# Altium footprint library TangCW.PcbLib: 46 footprints (part 1 of 3)
Each footprint in its own frame and in the unit in brackets; x right, y up, seen from the top. Pads: shape width x height; smd on the part's side, far side on the other; paste and mask are expansions set on the pad; w line width, h text height; cw(c..) or ccw(c..) is an arc to the next point about the centre after c.
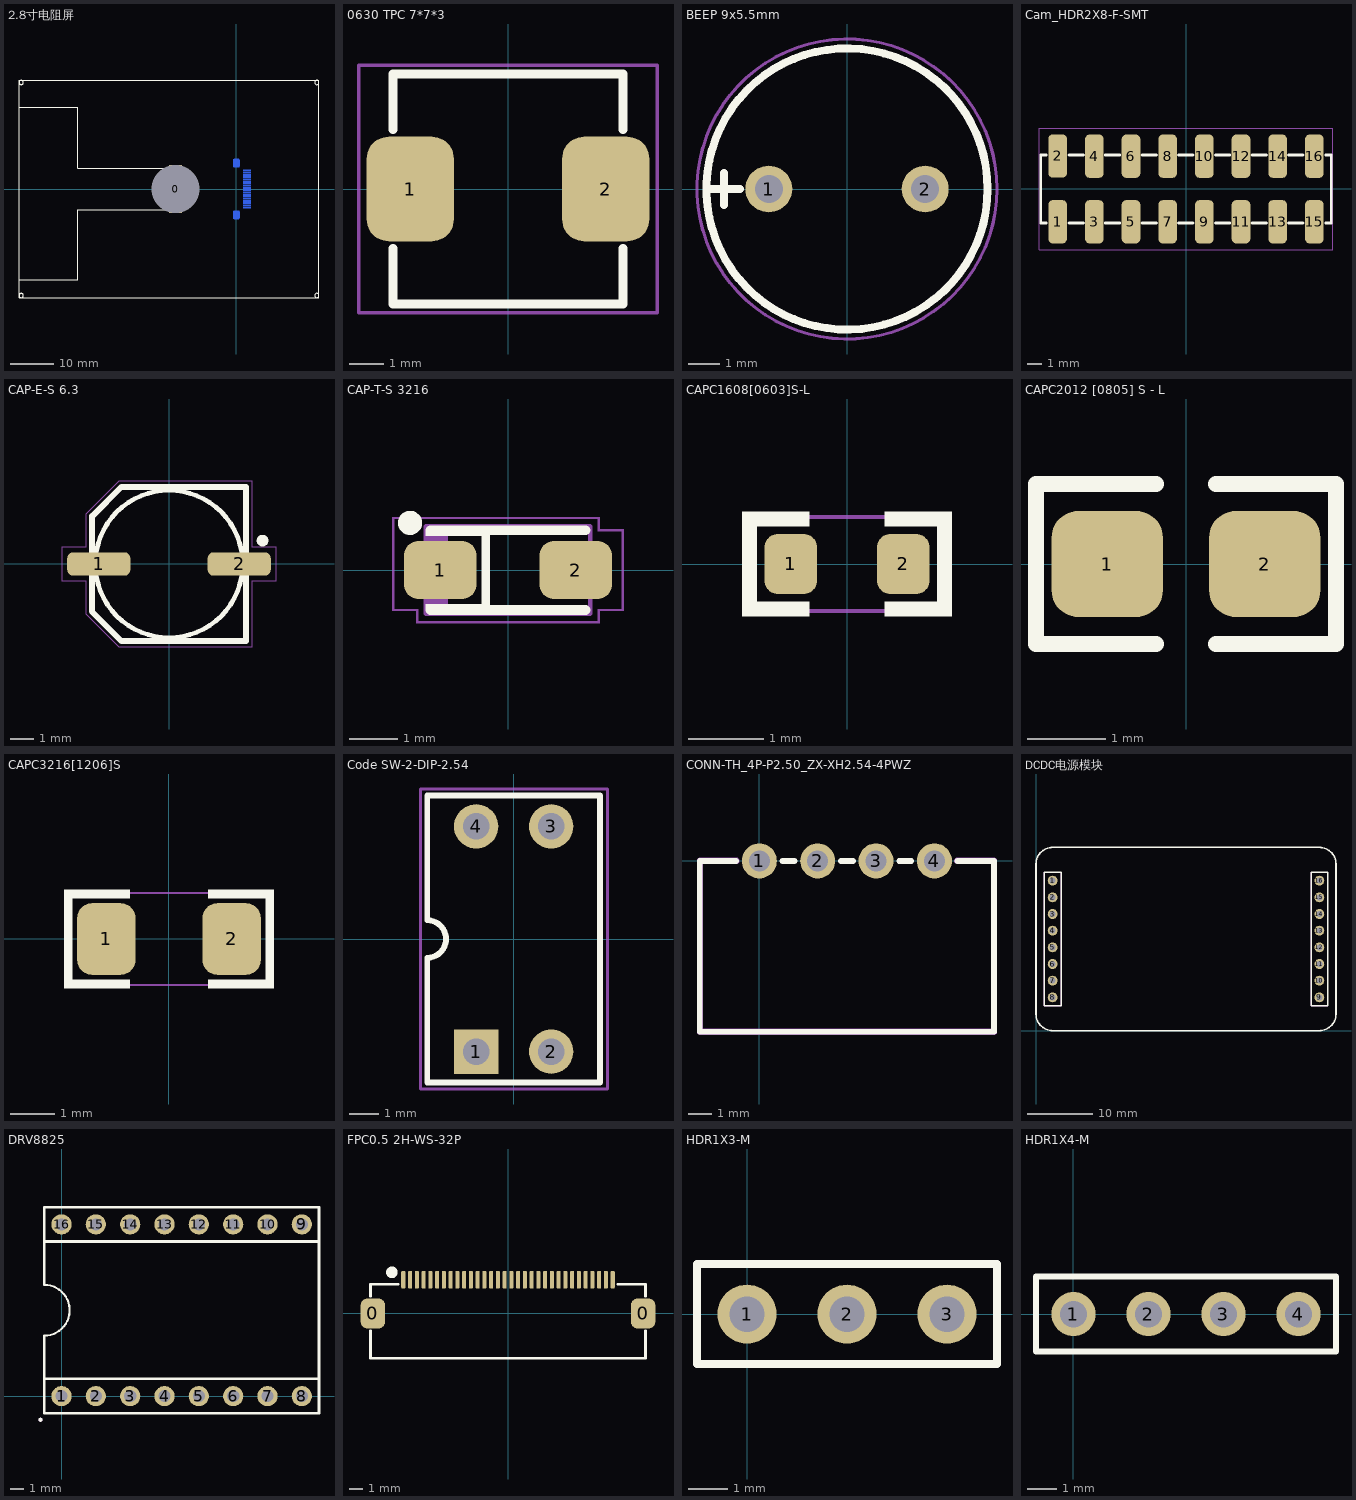
[diagram p0: the footprints below, top view; thin cyan lines are the x and y axes]

## 2.8寸电阻屏 [mm]
pads (21):
  rect 3x11 hole 11 square: 0(-14,0)
  rrect50% 1.8x0.3 smd far side: 1(2.45,4.25) 2(2.45,3.75) 3(2.45,3.25) 4(2.45,2.75) 5(2.45,2.25) 6(2.45,1.75) 7(2.45,1.25) 8(2.45,0.75) 9(2.45,0.25) 10(2.45,-0.25) 11(2.45,-0.75) 12(2.45,-1.25) 13(2.45,-1.75) 14(2.45,-2.25) 15(2.45,-2.75) 16(2.45,-3.25) 17(2.45,-3.75) 18(2.45,-4.25)
  rrect50% 1.5x2 smd far side: 19(0,-5.95) 20(0,5.95)
Top Overlay:
  circle w0.2: c18.52,24.52 r0.5
  circle w0.2: c18.52,-24.52 r0.5
  circle w0.2: c-49.52,-24.52 r0.5
  circle w0.2: c-49.52,24.52 r0.5
  lines w0.254: -50,-20.94 -36.5,-20.94 -36.5,-4.75 -15.8,-4.75 ; -50,18.87 -36.5,18.87 -36.5,4.75 -15.8,4.75 ; -50,-25 19,-25 19,25 -50,25 -50,-25
Bottom Overlay:
  circle w0.254: c3.786,4.263 r0.127
  lines w0.254: -12.2,-4.75 -3.15,-4.75 ; -12.2,4.75 -3.15,4.75 ; -0.981,-6.7 -3.15,-6.7 -3.15,6.7 -0.981,6.7 ; 0.981,-6.7 1.85,-6.7 1.85,-4.631 ; 0.981,6.7 1.85,6.7 1.85,4.631

## 0630 TPC 7*7*3 [mm]
pads (2):
  rrect50% 2.5x3 smd: 1(-2.8,0) 2(2.8,0)
Top Overlay:
  lines w0.254: -3.3,-1.7 -3.3,-3.3 3.3,-3.3 3.3,-1.7 ; -3.3,1.7 -3.3,3.3 3.3,3.3 3.3,1.7
Top Component Outline:
  lines w0.1: -4.275,-3.55 4.275,-3.55 4.275,3.55 -4.275,3.55 -4.275,-3.55
3D body: height 3, standoff 0, extent -3.3,-3.3 3.3,3.3

## BEEP 9x5.5mm [mm]
pads (2):
  round 1.5 hole 0.9: 1(-2.5,0) 2(2.5,0)
Top Overlay:
  circle w0.254: c0,0 r4.5
  lines w0.254: -4.496,0 -3.429,0 ; -3.937,-0.508 -3.937,0.508
Top Component Outline:
  circle w0.1: c0,0 r4.8
3D body "cx-0905c.stp": height 5.05, standoff -5.45, extent -4.8,-4.8 4.8,4.8

## Cam_HDR2X8-F-SMT [mm]
pads (16):
  rrect50% 1.3x3 smd: 1(-8.89,-2.27) 2(-8.89,2.286) 3(-6.35,-2.27) 4(-6.35,2.27) 5(-3.81,-2.27) 6(-3.81,2.27) 7(-1.27,-2.27) 8(-1.27,2.27) 9(1.27,-2.27) 10(1.27,2.27) 11(3.81,-2.27) 12(3.81,2.27) 13(6.35,-2.27) 14(6.35,2.27) 15(8.89,-2.27) 16(8.89,2.27)
Top Overlay:
  lines w0.2: -9.677,-2.35 -10.058,-2.35 -10.058,2.35 -9.677,2.35 ; -8.11,-2.35 -7.11,-2.35 ; -8.11,2.35 -7.11,2.35 ; -5.59,-2.35 -4.59,-2.35 ; -5.59,2.35 -4.59,2.35 ; -3.05,-2.35 -2.05,-2.35 ; -3.05,2.35 -2.05,2.35 ; -0.51,-2.35 0.49,-2.35 ; -0.51,2.35 0.49,2.35 ; 2.03,-2.35 3.03,-2.35 ; 2.03,2.35 3.03,2.35 ; 4.57,-2.35 5.57,-2.35 ; 4.57,2.35 5.57,2.35 ; 7.11,-2.35 8.11,-2.35 ; 7.11,2.35 8.11,2.35 ; 9.677,-2.35 10.058,-2.35 10.058,2.35 9.677,2.35
Top Component Outline:
  lines w0.05: -10.16,-4.2 -10.16,4.2 10.16,4.2 10.16,-4.2 -10.16,-4.2
3D body "61001621821-无盖.STEP": height 7.47, standoff -0.03, extent -10.16,-3.35 10.16,3.35
3D body "摄像头转接板 V3.0.step": height 14.2, standoff 1.85, extent -10.8,-5 10.8,5

## CAP-E-S 6.3 [mm]
pads (2):
  rrect50% 2.7x1 smd: 1(-3,0) 2(3,0)
Top Overlay:
  circle w0.25: c4,1 r0.125
  circle w0.2: c0,0 r3.15
  lines w0.254: -3.3,2.032 -3.3,-2.032 -2.032,-3.3 3.3,-3.3 3.3,3.3 -2.032,3.3 -3.287,2.045
Top Component Outline:
  region: -3.525,0.7 -3.525,0.75 -4.6,0.75 -4.6,0.7
  region: -3.525,2.15 -3.575,2.15 -3.575,0.7 -3.525,0.7
  rectangle: -4.6,-0.75 -4.55,0.75
  region: -3.525,-0.75 -3.525,-0.7 -4.6,-0.7 -4.6,-0.75
  rectangle: -3.575,-2.15 -3.525,-0.7
  region: 3.575,3.525 3.575,3.575 -2.15,3.575 -2.15,3.525
  region: -2.115,3.54 -2.15,3.575 -3.575,2.15 -3.54,2.115
  region: -2.15,-3.525 -2.15,-3.575 3.575,-3.575 3.575,-3.525
  region: -3.54,-2.115 -3.575,-2.15 -2.15,-3.575 -2.115,-3.54
  region: 3.575,3.575 3.525,3.575 3.525,0.7 3.575,0.7
  region: 3.525,0.75 3.525,0.7 4.6,0.7 4.6,0.75
  region: 4.6,0.75 4.55,0.75 4.55,-0.75 4.6,-0.75
  region: 4.6,-0.75 4.6,-0.7 3.525,-0.7 3.525,-0.75
  region: 3.575,-0.7 3.525,-0.7 3.525,-3.575 3.575,-3.575
3D body "SL-E.step": height 5.2, standoff 0, extent -3.5,-3.302 3.5,3.298

## CAP-T-S 3216 [mm]
pads (2):
  rrect50% 1.5x1.2 smd: 1(-1.4,0) 2(1.4,0)
Top Overlay:
  circle w0.25: c-2.025,0.975 r0.125
  rectangle: -1.7,0.7 -0.375,0.85
  region: -0.375,-0.7 -1.7,-0.7 -1.7,-0.825 -0.375,-0.825
  rectangle: -0.55,-0.9 -0.375,0.85
  lines w0.2: -1.6,-0.825 1.6,-0.825 ; -1.6,0.825 1.6,0.825
Mechanical 13:
  rectangle: -1.7,-0.9 -1.243,0.9
  lines w0.1: -1.7,-0.9 -1.7,0.9 1.7,0.9 1.7,-0.9 -1.7,-0.9
Top Component Outline:
  region: -1.85,-0.8 -1.9,-0.8 -1.9,-1.1 -1.85,-1.1
  region: -1.85,-0.85 -1.85,-0.8 -2.4,-0.8 -2.4,-0.85
  rectangle: 1.85,-1.1 1.9,-0.8
  region: 2.4,-0.85 2.4,-0.8 1.85,-0.8 1.85,-0.85
  rectangle: 1.85,0.8 1.9,1.1
  region: 1.85,0.85 1.85,0.8 2.4,0.8 2.4,0.85
  rectangle: -2.4,-0.85 -2.35,1.1
  region: 1.9,1.05 1.9,1.1 -2.4,1.1 -2.4,1.05
  region: 2.4,0.85 2.35,0.85 2.35,-0.85 2.4,-0.85
  region: -1.9,-1.05 -1.9,-1.1 1.9,-1.1 1.9,-1.05
3D body "TAJ-A.STEP": height 1.6, standoff 0, extent -1.6,-0.8 1.6,0.8

## CAPC1608[0603]S-L [mm]
pads (2):
  rrect50% 0.7x0.8 smd: 1(-0.75,0) 2(0.75,0)
Top Overlay:
  rectangle: -1.4,0.5 -0.5,0.7
  region: -1.4,0.7 -1.4,-0.7 -1.2,-0.7 -1.2,0.7
  rectangle: -1.4,-0.7 -0.5,-0.5
  region: 1.4,-0.5 0.5,-0.5 0.5,-0.7 1.4,-0.7
  region: 1.4,-0.7 1.4,0.7 1.2,0.7 1.2,-0.7
  region: 1.4,0.7 0.5,0.7 0.5,0.5 1.4,0.5
Top Component Outline:
  rectangle: -1.35,-0.65 -1.3,0.65
  region: 1.35,0.6 1.35,0.65 -1.35,0.65 -1.35,0.6
  region: 1.35,0.65 1.3,0.65 1.3,-0.65 1.35,-0.65
  region: -1.35,-0.6 -1.35,-0.65 1.35,-0.65 1.35,-0.6
3D body: height 0.79, standoff 0, extent -0.8,-0.406 -0.45,0.406
3D body: height 0.79, standoff 0, extent 0.45,-0.406 0.8,0.407
3D body: height 0.79, standoff 0, extent -0.45,-0.406 0.45,0.406

## CAPC2012 [0805] S - L [mm]
pads (2):
  rrect50% 1.414x1.35 smd: 1(-1,0) 2(1,0)
Top Overlay:
  lines w0.2: -0.381,-1.016 -1.905,-1.016 -1.905,1.016 -0.381,1.016 ; 0.381,-1.016 1.905,-1.016 1.905,1.016 0.381,1.016
3D body "0805 SMD Capacitor.STEP": height 0.78, standoff 0, extent -1,-0.625 1,0.625

## CAPC3216[1206]S [mm]
pads (2):
  rrect50% 1.3x1.6 smd: 1(-1.4,0) 2(1.4,0)
Top Overlay:
  region: -2.35,1.1 -2.35,-1.1 -2.15,-1.1 -2.15,1.1
  region: 2.35,-1.1 2.35,1.1 2.15,1.1 2.15,-1.1
  rectangle: -2.35,0.9 -0.875,1.1
  region: 2.346,1.106 0.871,1.106 0.871,0.906 2.346,0.906
  rectangle: -2.35,-1.1 -0.875,-0.9
  region: 2.346,-0.906 0.871,-0.906 0.871,-1.106 2.346,-1.106
Top Component Outline:
  region: -2.3,-1 -2.3,-1.05 2.3,-1.05 2.3,-1
  region: 2.3,1.05 2.25,1.05 2.25,-1.05 2.3,-1.05
  region: 2.3,1 2.3,1.05 -2.3,1.05 -2.3,1
  rectangle: -2.3,-1.05 -2.25,1.05
3D body "C 1206.STEP": height 1.21, standoff -0.01, extent -1.6,-0.81 1.6,0.81

## Code SW-2-DIP-2.54 [mm]
pads (4):
  rect 1.5x1.5 hole 0.9: 1(-1.27,-3.81)
  round 1.5 hole 0.9: 2(1.27,-3.81) 3(1.27,3.81) 4(-1.27,3.81)
Top Overlay:
  lines w0.2: -2.925,-4.85 2.925,-4.85 2.925,4.85 -2.925,4.85 -2.925,0.635 cw(c-2.925,0) -2.925,-0.635 -2.925,-4.85
Top Component Outline:
  lines w0.1: -3.15,-5.075 -3.15,5.075 3.175,5.075 3.175,-5.075 -3.15,-5.075
3D body "Switch-DIP-2.STEP": height 7.03, standoff -3.67, extent -3.04,-4.95 3.04,4.95

## CONN-TH_4P-P2.50_ZX-XH2.54-4PWZ [mm]
pads (4):
  round 1.5 hole 0.9 paste-2539.97 mask+0.05: 1(0,0) 2(2.5,0) 3(5,0) 4(7.5,0)
Top Overlay:
  lines w0.254: -0.993,0 -2.553,0 -2.553,-7.32 10.053,-7.32 ; 0.993,0 1.507,0 ; 3.493,0 4.007,0 ; 5.993,0 6.507,0 ; 8.493,0 10.053,0 10.053,-7.239
Bottom Component Outline:
  region: -0.985,-0.127 -2.418,-0.127 -2.418,-7.188 9.928,-7.188 9.928,-0.122 8.485,-0.122 8.432,-0.122 8.358,-0.048 8.358,0.058 8.432,0.132 8.485,0.132 10.055,0.132 10.08,0.132 10.127,0.113 10.163,0.077 10.182,0.03 10.182,0.005 10.182,-7.315 10.182,-7.34 10.163,-7.387 10.127,-7.423 10.08,-7.442 10.055,-7.442 -2.545,-7.442 -2.57,-7.442 -2.617,-7.423 -2.653,-7.387 -2.672,-7.34 -2.672,-7.315 -2.672,0 -2.672,0.025 -2.653,0.072 -2.617,0.108 -2.57,0.127 -2.545,0.127 -0.985,0.127 -0.932,0.127 -0.858,0.053 -0.858,-0.053 -0.932,-0.127
3D body "3D_PCB1_2024-09-15.step": height 5.9, standoff -3.4, extent -2.505,-7.32 10.005,0.32

## DCDC电源模块 [mm]
pads (16):
  round 1.5 hole 0.9: 1(2.54,22.86) 2(2.54,20.32) 3(2.54,17.78) 4(2.54,15.24) 5(2.54,12.7) 6(2.54,10.16) 7(2.54,7.62) 8(2.54,5.08) 9(43.18,5.08) 10(43.18,7.62) 11(43.18,10.16) 12(43.18,12.7) 13(43.18,15.24) 14(43.18,17.78) 15(43.18,20.32) 16(43.18,22.86)
Top Overlay:
  lines w0.2: 1.27,3.81 3.81,3.81 3.81,24.13 1.27,24.13 1.27,3.81 ; 41.91,3.81 44.45,3.81 44.45,24.13 41.91,24.13 41.91,3.81
  lines w0.254: 43.18,27.94 cw(c43.18,25.4) 45.72,25.4 45.72,2.54 cw(c43.18,2.54) 43.18,0 2.54,0 cw(c2.54,2.54) 0,2.54 0,25.4 cw(c2.54,25.4) 2.54,27.94 43.18,27.941
Top Component Outline:
  lines w0.1: 1.27,3.81 3.81,3.81 3.81,24.13 1.27,24.13 1.27,3.81 ; 41.91,3.81 44.45,3.81 44.45,24.13 41.91,24.13 41.91,3.81
3D body "三子棋电源模块_PCB.step": height 22.49, standoff 2.05, extent 0,0 45.72,27.94

## DRV8825 [mm]
pads (16):
  round 1.5 hole 0.9: 1(0,0) 2(2.54,0) 3(5.08,0) 4(7.62,0) 5(10.16,0) 6(12.7,0) 7(15.24,0) 8(17.78,0) 9(17.78,12.7) 10(15.24,12.7) 11(12.7,12.7) 12(10.16,12.7) 13(7.62,12.7) 14(5.08,12.7) 15(2.54,12.7) 16(0,12.7)
Top Overlay:
  circle w0.15: c-1.557,-1.752 r0.075
  lines w0.152: -1.27,4.475 ccw(c-1.27,6.35) -1.27,8.225
  lines w0.2: -1.27,4.445 -1.27,1.27 ; -1.27,8.255 -1.27,11.43 ; -1.27,1.27 19.05,1.27 ; -1.27,1.27 -1.27,-1.27 19.05,-1.27 19.05,1.27 ; -1.27,11.43 -1.27,13.97 19.05,13.97 19.05,11.43 ; -1.27,11.43 19.05,11.43 ; 19.05,1.27 19.05,11.43
Top Component Outline:
  lines w0.1: -1.27,-1.27 -1.27,1.27 19.05,1.27 19.05,-1.27 -1.27,-1.27 ; -1.27,11.43 -1.27,13.97 19.05,13.97 19.05,11.43 -1.27,11.43
Bottom Component Outline:
  circle w0.15: c-1.557,-1.752 r0.075

## FPC0.5 2H-WS-32P [mm]
pads (34):
  rrect50% 1.8x2.2 smd: 0(-10,0) 0(10,0)
  rrect50% 0.3x1.3 smd: 1(-7.75,2.497) 2(-7.25,2.497) 3(-6.75,2.497) 4(-6.25,2.497) 5(-5.75,2.497) 6(-5.25,2.497) 7(-4.75,2.497) 8(-4.25,2.497) 9(-3.75,2.497) 10(-3.25,2.497) 11(-2.75,2.497) 12(-2.25,2.497) 13(-1.75,2.497) 14(-1.25,2.497) 15(-0.75,2.497) 16(-0.25,2.497) 17(0.25,2.497) 18(0.75,2.497) 19(1.25,2.497) 20(1.75,2.497) 21(2.25,2.497) 22(2.75,2.497) 23(3.25,2.497) 24(3.75,2.497) 25(4.25,2.497) 26(4.75,2.497) 27(5.25,2.497) 28(5.75,2.497) 29(6.25,2.497) 30(6.75,2.497) 31(7.25,2.497) 32(7.75,2.497)
Top Overlay:
  circle w0.5: c-8.594,3.048 r0.18
  lines w0.2: -10.175,-1.27 -10.175,-3.302 10.175,-3.302 10.175,-1.27 ; -10.175,1.27 -10.175,2.159 -8.143,2.159 ; 8.143,2.159 10.175,2.159 10.175,1.27
3D body "FPC0.5 2H-S-W-32P.STEP": height 2, standoff -0.01, extent -10.1,-3.15 10.1,2.85

## HDR1X3-M [mm]
pads (3):
  round 1.5 hole 0.9: 1(0,0) 2(2.54,0) 3(5.08,0)
Top Overlay:
  lines w0.2: -1.27,-1.27 6.35,-1.27 6.35,1.27 -1.27,1.27 -1.27,-1.27
Top Component Outline:
  lines w0.1: -1.27,-1.27 6.35,-1.27 6.35,1.275 -1.27,1.275 -1.27,-1.27
3D body "1001-3.STEP": height 8.54, standoff -3, extent -1.27,-1.27 6.35,1.27

## HDR1X4-M [mm]
pads (4):
  round 1.5 hole 0.9: 1(0,0) 2(2.54,0) 3(5.08,0) 4(7.62,0)
Top Overlay:
  lines w0.2: -1.27,-1.27 8.89,-1.27 8.89,1.27 -1.27,1.27 -1.27,-1.27
Top Component Outline:
  lines w0.1: -1.27,-1.27 -1.27,1.275 8.89,1.275 8.89,-1.27 -1.27,-1.27
3D body "1001-4.STEP": height 8.54, standoff -3, extent -1.27,-1.27 8.89,1.27